# Altium footprint library PcbLib_ICs.PcbLib: 317 footprints (part 21 of 24)
Each footprint in its own frame and in the unit in brackets; x right, y up, seen from the top. Pads: shape width x height; smd on the part's side, far side on the other; paste and mask are expansions set on the pad; w line width, h text height; cw(c..) or ccw(c..) is an arc to the next point about the centre after c.
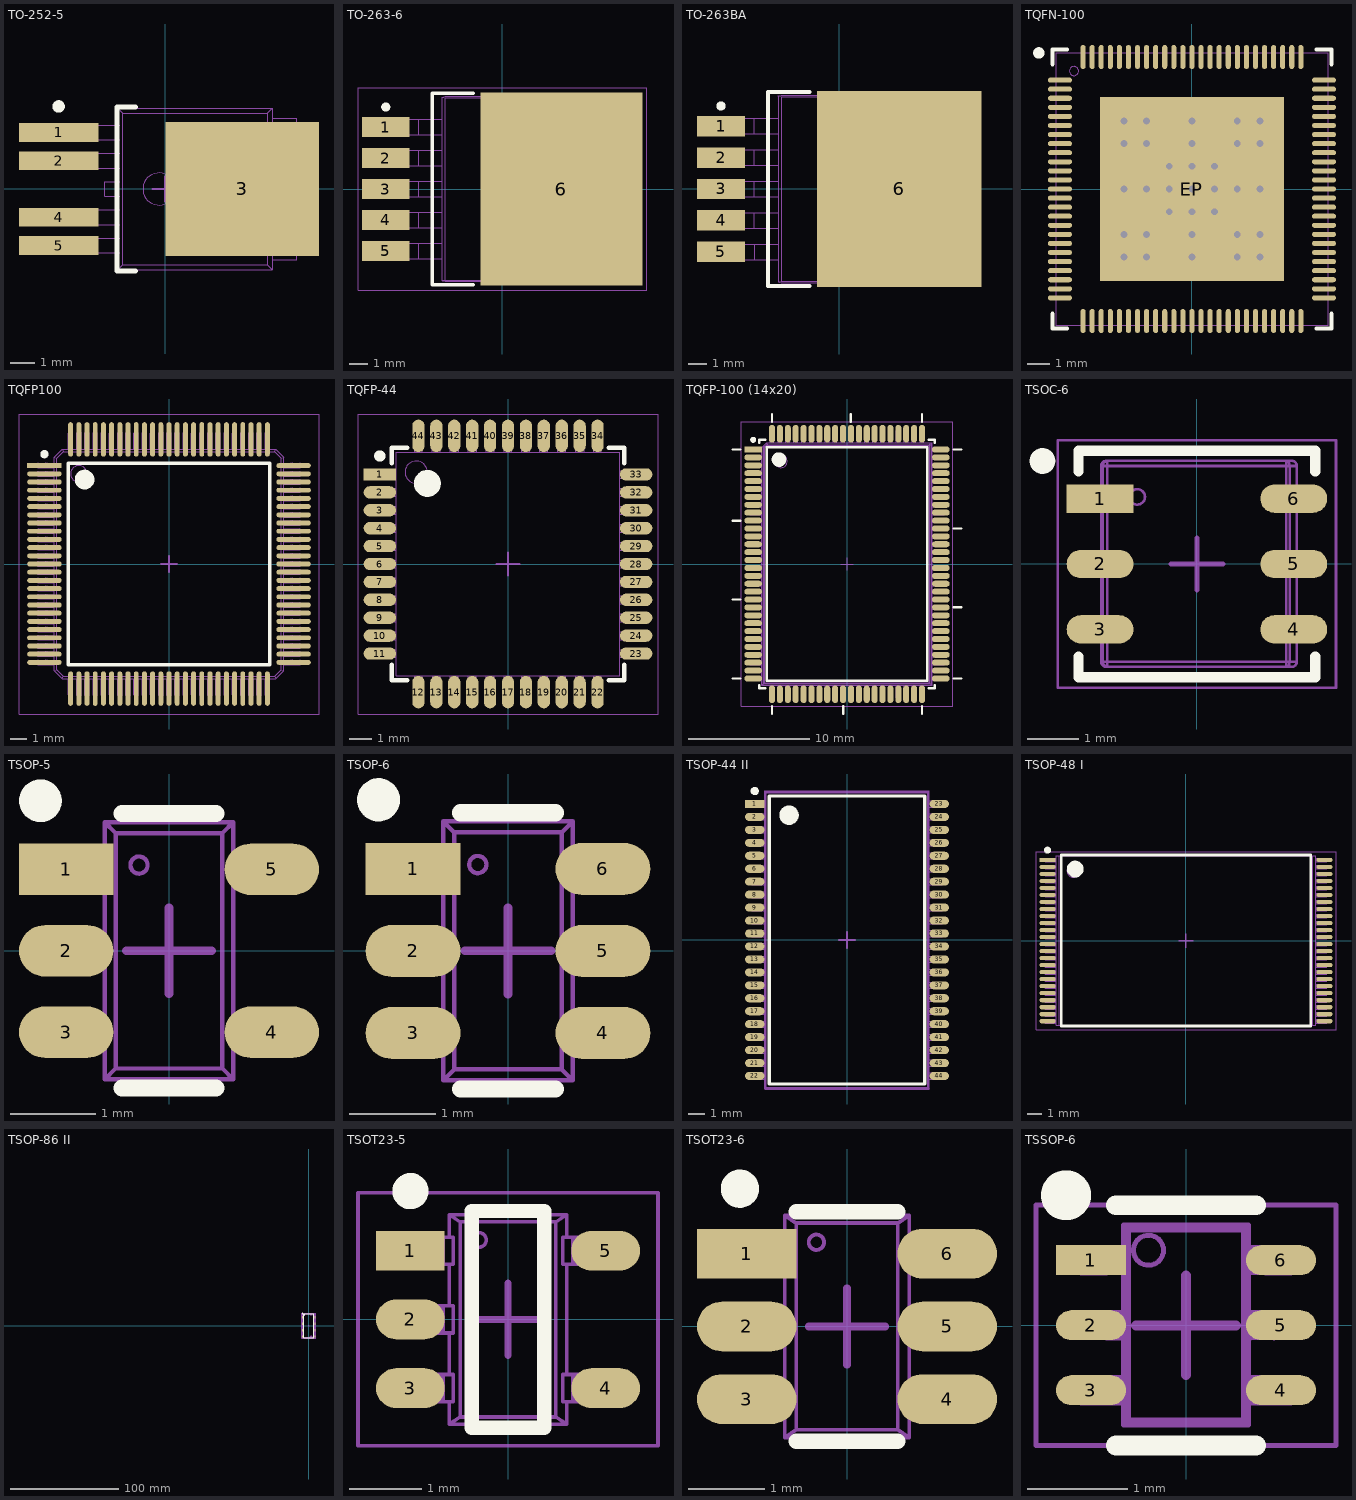
[diagram p20: the footprints below, top view; thin cyan lines are the x and y axes]

## TO-252-5 [mm] "D-PAK, 5-Pads, Body 6.15x6.66mm (max), IPC Medium Density"
height 2.38
pads (5):
  rect 3.2x0.75 smd paste+0 mask+0.05: 1(-4.3,2.28) 2(-4.3,1.14) 4(-4.3,-1.14) 5(-4.3,-2.28)
  rect 6.2x5.4 smd paste-50 mask+0.05: 3(3.1,0)
Top Overlay:
  circle w0.25: c-4.3,3.33 r0.125
  lines w0.2: -1.2,-3.3 -1.95,-3.3 -1.95,3.3 -1.2,3.3
Top Paste:
  region: 0.65,2.1 0.65,2.7 0.05,2.7 0.05,2.1
  region: 1.45,2.1 1.45,2.7 0.85,2.7 0.85,2.1
  region: 2.25,2.1 2.25,2.7 1.65,2.7 1.65,2.1
  region: 3.05,2.1 3.05,2.7 2.45,2.7 2.45,2.1
  region: 3.85,2.1 3.85,2.7 3.25,2.7 3.25,2.1
  region: 4.65,2.1 4.65,2.7 4.05,2.7 4.05,2.1
  region: 5.45,2.1 5.45,2.7 4.85,2.7 4.85,2.1
  region: 0.65,1.3 0.65,1.9 0.05,1.9 0.05,1.3
  region: 1.45,1.3 1.45,1.9 0.85,1.9 0.85,1.3
  region: 2.25,1.3 2.25,1.9 1.65,1.9 1.65,1.3
  region: 3.05,1.3 3.05,1.9 2.45,1.9 2.45,1.3
  region: 3.85,1.3 3.85,1.9 3.25,1.9 3.25,1.3
  region: 4.65,1.3 4.65,1.9 4.05,1.9 4.05,1.3
  region: 5.45,1.3 5.45,1.9 4.85,1.9 4.85,1.3
  region: 0.65,0.5 0.65,1.1 0.05,1.1 0.05,0.5
  region: 1.45,0.5 1.45,1.1 0.85,1.1 0.85,0.5
  region: 2.25,0.5 2.25,1.1 1.65,1.1 1.65,0.5
  region: 3.05,0.5 3.05,1.1 2.45,1.1 2.45,0.5
  region: 3.85,0.5 3.85,1.1 3.25,1.1 3.25,0.5
  region: 4.65,0.5 4.65,1.1 4.05,1.1 4.05,0.5
  region: 5.45,0.5 5.45,1.1 4.85,1.1 4.85,0.5
  region: 0.65,-0.3 0.65,0.3 0.05,0.3 0.05,-0.3
  region: 1.45,-0.3 1.45,0.3 0.85,0.3 0.85,-0.3
  region: 2.25,-0.3 2.25,0.3 1.65,0.3 1.65,-0.3
  region: 3.05,-0.3 3.05,0.3 2.45,0.3 2.45,-0.3
  region: 3.85,-0.3 3.85,0.3 3.25,0.3 3.25,-0.3
  region: 4.65,-0.3 4.65,0.3 4.05,0.3 4.05,-0.3
  region: 5.45,-0.3 5.45,0.3 4.85,0.3 4.85,-0.3
  region: 0.65,-1.1 0.65,-0.5 0.05,-0.5 0.05,-1.1
  region: 1.45,-1.1 1.45,-0.5 0.85,-0.5 0.85,-1.1
  region: 2.25,-1.1 2.25,-0.5 1.65,-0.5 1.65,-1.1
  region: 3.05,-1.1 3.05,-0.5 2.45,-0.5 2.45,-1.1
  region: 3.85,-1.1 3.85,-0.5 3.25,-0.5 3.25,-1.1
  region: 4.65,-1.1 4.65,-0.5 4.05,-0.5 4.05,-1.1
  region: 5.45,-1.1 5.45,-0.5 4.85,-0.5 4.85,-1.1
  region: 0.65,-1.9 0.65,-1.3 0.05,-1.3 0.05,-1.9
  region: 1.45,-1.9 1.45,-1.3 0.85,-1.3 0.85,-1.9
  region: 2.25,-1.9 2.25,-1.3 1.65,-1.3 1.65,-1.9
  region: 3.05,-1.9 3.05,-1.3 2.45,-1.3 2.45,-1.9
  region: 3.85,-1.9 3.85,-1.3 3.25,-1.3 3.25,-1.9
  region: 4.65,-1.9 4.65,-1.3 4.05,-1.3 4.05,-1.9
  region: 5.45,-1.9 5.45,-1.3 4.85,-1.3 4.85,-1.9
  region: 0.65,-2.7 0.65,-2.1 0.05,-2.1 0.05,-2.7
  region: 1.45,-2.7 1.45,-2.1 0.85,-2.1 0.85,-2.7
  region: 2.25,-2.7 2.25,-2.1 1.65,-2.1 1.65,-2.7
  region: 3.05,-2.7 3.05,-2.1 2.45,-2.1 2.45,-2.7
  region: 3.85,-2.7 3.85,-2.1 3.25,-2.1 3.25,-2.7
  region: 4.65,-2.7 4.65,-2.1 4.05,-2.1 4.05,-2.7
  region: 5.45,-2.7 5.45,-2.1 4.85,-2.1 4.85,-2.7
Top Assy:
  circle w0.05: c-0.25,0 r0.65
  lines w0.05: -1.91,-2.58 -1.91,-3.25 ; -1.91,-1.98 -1.91,-1.44 ; -1.91,-0.84 -1.91,-0.3 ; -1.91,0.3 -1.91,0.84 ; -1.91,1.44 -1.91,1.98 ; -1.91,2.58 -1.91,3.25 ; -1.839,-2.58 -3.091,-2.58 ; -1.839,-1.98 -3.091,-1.98 ; -1.839,-1.44 -3.091,-1.44 ; -1.839,-0.84 -3.091,-0.84 ; -1.839,-0.3 -2.45,-0.3 -2.45,0.3 -1.839,0.3 ; -1.839,0.84 -3.091,0.84 ; -1.839,1.44 -3.091,1.44 ; -1.839,1.98 -3.091,1.98 ; -1.839,2.58 -3.091,2.58 ; 4.31,-2.85 5.3,-2.85 5.3,-2.2 5.15,-2.2 5.15,2.2 5.3,2.2 5.3,2.85 4.31,2.85 ; -4.159,-2.58 -4.159,-1.98 ; -4.159,-2.58 -3.985,-2.58 ; -4.159,-2.58 -4.6,-2.58 -4.6,-1.98 -4.159,-1.98 ; -4.159,-1.98 -3.985,-1.98 ; -4.159,-1.44 -4.159,-0.84 ; -4.159,-1.44 -3.985,-1.44 ; -4.159,-1.44 -4.6,-1.44 -4.6,-0.84 -4.159,-0.84 ; -4.159,-0.84 -3.985,-0.84 ; -4.159,0.84 -4.159,1.44 ; -4.159,0.84 -3.985,0.84 ; -4.159,0.84 -4.6,0.84 -4.6,1.44 -4.159,1.44 ; -4.159,1.44 -3.985,1.44 ; -4.159,1.98 -4.159,2.58 ; -4.159,1.98 -3.985,1.98 ; -4.159,1.98 -4.6,1.98 -4.6,2.58 -4.159,2.58 ; -4.159,2.58 -3.985,2.58 ; -3.985,-2.58 -3.091,-2.58 ; -3.985,-2.58 -3.985,-1.98 ; -3.985,-1.98 -3.091,-1.98 ; -3.985,-1.44 -3.091,-1.44 ; -3.985,-1.44 -3.985,-0.84 ; -3.985,-0.84 -3.091,-0.84 ; -3.985,0.84 -3.091,0.84 ; -3.985,0.84 -3.985,1.44 ; -3.985,1.44 -3.091,1.44 ; -3.985,1.98 -3.091,1.98 ; -3.985,1.98 -3.985,2.58 ; -3.985,2.58 -3.091,2.58 ; -3.091,-2.58 -3.091,-1.98 ; -3.091,-1.44 -3.091,-0.84 ; -3.091,0.84 -3.091,1.44 ; -3.091,1.98 -3.091,2.58 ; -1.91,-3.25 4.31,-3.25 ; -1.91,-3.25 -1.71,-3.05 ; -1.91,3.25 4.31,3.25 ; -1.91,3.25 -1.71,3.05 ; -1.71,-3.05 4.11,-3.05 ; -1.71,-3.05 -1.71,3.05 ; -1.71,3.05 4.11,3.05 ; 4.11,-3.05 4.11,3.05 ; 4.11,-3.05 4.31,-3.25 ; 4.11,3.05 4.31,3.25 ; 4.31,-3.25 4.31,3.25
  text ".Designator" at 1.55,5.162 h3
Top Text:
  lines w0.1: -0.5,0 0.5,0 ; 0,-0.5 0,0.5
3D body "User Library-PG-TO252-5-11-1.STEP": height 2.3, standoff 0, extent -4.6,-3.25 5.3,3.25

## TO-263-6 [mm] "D2-PAK, 6-Pads, Body 7.80x8.61mm (max), IPC Medium Density"
height 4.57
pads (6):
  rect 2.6x1.1 smd: 1(-6.4,3.4) 2(-6.4,1.7) 3(-6.4,0) 4(-6.4,-1.7) 5(-6.4,-3.4)
  rect 8.9x10.6 smd paste-10: 6(3.25,0)
Top Overlay:
  circle w0.25: c-6.4,4.5 r0.125
  lines w0.2: -1.6,-5.25 -3.85,-5.25 -3.85,5.25 -1.6,5.25
Top Paste:
  rectangle: 6.4,-3.95 7.4,-2.95
  rectangle: 6.4,-2.8 7.4,-1.8
  rectangle: 6.4,-1.65 7.4,-0.65
  rectangle: 6.4,-0.5 7.4,0.5
  rectangle: 6.4,0.65 7.4,1.65
  rectangle: 6.4,1.8 7.4,2.8
  rectangle: 6.4,2.95 7.4,3.95
  rectangle: 6.4,4.1 7.4,5.1
  rectangle: 5.167,-3.95 6.167,-2.95
  rectangle: 5.167,-2.8 6.167,-1.8
  rectangle: 5.167,-1.65 6.167,-0.65
  rectangle: 5.167,-0.5 6.167,0.5
  rectangle: 5.167,0.65 6.167,1.65
  rectangle: 5.167,1.8 6.167,2.8
  rectangle: 5.167,2.95 6.167,3.95
  rectangle: 5.167,4.1 6.167,5.1
  rectangle: 3.933,-3.95 4.933,-2.95
  rectangle: 3.933,-2.8 4.933,-1.8
  rectangle: 3.933,-1.65 4.933,-0.65
  rectangle: 3.933,-0.5 4.933,0.5
  rectangle: 3.933,0.65 4.933,1.65
  rectangle: 3.933,1.8 4.933,2.8
  rectangle: 3.933,2.95 4.933,3.95
  rectangle: 3.933,4.1 4.933,5.1
  rectangle: 2.7,-3.95 3.7,-2.95
  rectangle: 2.7,-2.8 3.7,-1.8
  rectangle: 2.7,-1.65 3.7,-0.65
  rectangle: 2.7,-0.5 3.7,0.5
  rectangle: 2.7,0.65 3.7,1.65
  rectangle: 2.7,1.8 3.7,2.8
  rectangle: 2.7,2.95 3.7,3.95
  rectangle: 2.7,4.1 3.7,5.1
  rectangle: 1.467,-3.95 2.467,-2.95
  rectangle: 1.467,-2.8 2.467,-1.8
  rectangle: 1.467,-1.65 2.467,-0.65
  rectangle: 1.467,-0.5 2.467,0.5
  rectangle: 1.467,0.65 2.467,1.65
  rectangle: 1.467,1.8 2.467,2.8
  rectangle: 1.467,2.95 2.467,3.95
  rectangle: 1.467,4.1 2.467,5.1
  rectangle: 0.233,-3.95 1.233,-2.95
  rectangle: 0.233,-2.8 1.233,-1.8
  rectangle: 0.233,-1.65 1.233,-0.65
  rectangle: 0.233,-0.5 1.233,0.5
  rectangle: 0.233,0.65 1.233,1.65
  rectangle: 0.233,1.8 1.233,2.8
  rectangle: 0.233,2.95 1.233,3.95
  rectangle: 0.233,4.1 1.233,5.1
  rectangle: -1,4.1 0,5.1
  rectangle: -1,2.95 0,3.95
  rectangle: -1,1.8 0,2.8
  rectangle: -1,0.65 0,1.65
  rectangle: -1,-0.5 0,0.5
  rectangle: -1,-1.65 0,-0.65
  rectangle: -1,-2.8 0,-1.8
  rectangle: -1,-3.95 0,-2.95
  rectangle: 6.4,-5.1 7.4,-4.1
  rectangle: 5.167,-5.1 6.167,-4.1
  rectangle: 3.933,-5.1 4.933,-4.1
  rectangle: 2.7,-5.1 3.7,-4.1
  rectangle: 1.467,-5.1 2.467,-4.1
  rectangle: 0.233,-5.1 1.233,-4.1
  rectangle: -1,-5.1 0,-4.1
Top Assy:
  lines w0.05: -3.303,-3.827 -4.598,-3.827 ; -3.303,-2.987 -4.598,-2.987 ; -3.303,-2.122 -4.598,-2.122 ; -3.303,-1.282 -4.598,-1.282 ; -3.303,-0.417 -4.598,-0.417 ; -3.303,0.423 -4.598,0.423 ; -3.303,1.288 -4.598,1.288 ; -3.303,2.128 -4.598,2.128 ; -3.303,2.993 -4.598,2.993 ; -3.303,3.833 -4.598,3.833 ; -6.648,-3.827 -5.928,-3.827 ; -6.648,-3.827 -6.648,-2.987 ; -6.648,-3.827 -7.413,-3.827 -7.413,-2.987 -6.648,-2.987 ; -6.648,-2.987 -5.928,-2.987 ; -6.648,-2.122 -5.928,-2.122 ; -6.648,-2.122 -6.648,-1.282 ; -6.648,-2.122 -7.413,-2.122 -7.413,-1.282 -6.648,-1.282 ; -6.648,-1.282 -5.928,-1.282 ; -6.648,-0.417 -5.928,-0.417 ; -6.648,-0.417 -6.648,0.423 ; -6.648,-0.417 -7.413,-0.417 -7.413,0.423 -6.648,0.423 ; -6.648,0.423 -5.928,0.423 ; -6.648,1.288 -5.928,1.288 ; -6.648,1.288 -6.648,2.128 ; -6.648,1.288 -7.413,1.288 -7.413,2.128 -6.648,2.128 ; -6.648,2.128 -5.928,2.128 ; -6.648,2.993 -5.928,2.993 ; -6.648,2.993 -6.648,3.833 ; -6.648,2.993 -7.413,2.993 -7.413,3.833 -6.648,3.833 ; -6.648,3.833 -5.928,3.833 ; -5.928,-3.827 -4.598,-3.827 ; -5.928,-3.827 -5.928,-2.987 ; -5.928,-2.987 -4.598,-2.987 ; -5.928,-2.122 -5.928,-1.282 ; -5.928,-2.122 -4.598,-2.122 ; -5.928,-1.282 -4.598,-1.282 ; -5.928,-0.417 -5.928,0.423 ; -5.928,-0.417 -4.598,-0.417 ; -5.928,0.423 -4.598,0.423 ; -5.928,1.288 -5.928,2.128 ; -5.928,1.288 -4.598,1.288 ; -5.928,2.128 -4.598,2.128 ; -5.928,2.993 -4.598,2.993 ; -5.928,2.993 -5.928,3.833 ; -5.928,3.833 -4.598,3.833 ; -4.598,-3.827 -4.598,-2.987 ; -4.598,-2.122 -4.598,-1.282 ; -4.598,-0.417 -4.598,0.423 ; -4.598,1.288 -4.598,2.128 ; -4.598,2.993 -4.598,3.833 ; -3.303,-5.022 -3.303,5.028 ; -3.303,-5.022 -3.303,-5.032 -3.124,-5.077 5.332,-5.077 ; -3.303,-5.022 -3.128,-4.998 ; -3.303,5.028 -3.303,5.038 -3.124,5.083 5.332,5.083 ; -3.303,5.028 -3.128,5.004 ; -3.128,-4.998 4.93,-4.998 ; -3.128,-4.998 -3.128,5.004 ; -3.128,5.004 4.93,5.004 ; 4.93,-4.998 4.93,5.004 ; 4.93,-4.998 5.332,-5.055 5.332,-3.807 ; 4.93,5.004 5.332,5.061 5.332,3.813 ; 5.332,-5.077 6.252,-5.077 6.602,-3.769 6.602,3.775 6.252,5.083 5.332,5.083 ; 5.332,-5.077 5.332,-3.807 ; 5.332,-3.807 5.332,3.813 ; 5.332,3.813 5.332,5.083
  text ".Designator" at -3.443,-0.467 h2
Top Text:
  lines w0.05: -7.925,-5.55 7.925,-5.55 7.925,5.55 -7.925,5.55 -7.925,-5.55
  lines w0.1: -0.5,0 0.5,0 ; 0,-0.5 0,0.5
3D body "SW3dPS-LTC DD-PAK.STEP": height 4.5, standoff 0.01, extent -7.382,-5.062 6.969,5.162

## TO-263BA [mm] "D2-PAK, 6-Pads, Body 7.80x8.61mm (max), IPC Medium Density"
height 4.57
pads (6):
  rect 2.6x1.1 smd: 1(-6.4,3.4) 2(-6.4,1.7) 3(-6.4,0) 4(-6.4,-1.7) 5(-6.4,-3.4)
  rect 8.9x10.6 smd paste-10: 6(3.25,0)
Top Overlay:
  circle w0.25: c-6.4,4.5 r0.125
  lines w0.2: -1.6,-5.25 -3.85,-5.25 -3.85,5.25 -1.6,5.25
Top Paste:
  rectangle: 6.4,-3.95 7.4,-2.95
  rectangle: 6.4,-2.8 7.4,-1.8
  rectangle: 6.4,-1.65 7.4,-0.65
  rectangle: 6.4,-0.5 7.4,0.5
  rectangle: 6.4,0.65 7.4,1.65
  rectangle: 6.4,1.8 7.4,2.8
  rectangle: 6.4,2.95 7.4,3.95
  rectangle: 6.4,4.1 7.4,5.1
  rectangle: 5.167,-3.95 6.167,-2.95
  rectangle: 5.167,-2.8 6.167,-1.8
  rectangle: 5.167,-1.65 6.167,-0.65
  rectangle: 5.167,-0.5 6.167,0.5
  rectangle: 5.167,0.65 6.167,1.65
  rectangle: 5.167,1.8 6.167,2.8
  rectangle: 5.167,2.95 6.167,3.95
  rectangle: 5.167,4.1 6.167,5.1
  rectangle: 3.933,-3.95 4.933,-2.95
  rectangle: 3.933,-2.8 4.933,-1.8
  rectangle: 3.933,-1.65 4.933,-0.65
  rectangle: 3.933,-0.5 4.933,0.5
  rectangle: 3.933,0.65 4.933,1.65
  rectangle: 3.933,1.8 4.933,2.8
  rectangle: 3.933,2.95 4.933,3.95
  rectangle: 3.933,4.1 4.933,5.1
  rectangle: 2.7,-3.95 3.7,-2.95
  rectangle: 2.7,-2.8 3.7,-1.8
  rectangle: 2.7,-1.65 3.7,-0.65
  rectangle: 2.7,-0.5 3.7,0.5
  rectangle: 2.7,0.65 3.7,1.65
  rectangle: 2.7,1.8 3.7,2.8
  rectangle: 2.7,2.95 3.7,3.95
  rectangle: 2.7,4.1 3.7,5.1
  rectangle: 1.467,-3.95 2.467,-2.95
  rectangle: 1.467,-2.8 2.467,-1.8
  rectangle: 1.467,-1.65 2.467,-0.65
  rectangle: 1.467,-0.5 2.467,0.5
  rectangle: 1.467,0.65 2.467,1.65
  rectangle: 1.467,1.8 2.467,2.8
  rectangle: 1.467,2.95 2.467,3.95
  rectangle: 1.467,4.1 2.467,5.1
  rectangle: 0.233,-3.95 1.233,-2.95
  rectangle: 0.233,-2.8 1.233,-1.8
  rectangle: 0.233,-1.65 1.233,-0.65
  rectangle: 0.233,-0.5 1.233,0.5
  rectangle: 0.233,0.65 1.233,1.65
  rectangle: 0.233,1.8 1.233,2.8
  rectangle: 0.233,2.95 1.233,3.95
  rectangle: 0.233,4.1 1.233,5.1
  rectangle: -1,4.1 0,5.1
  rectangle: -1,2.95 0,3.95
  rectangle: -1,1.8 0,2.8
  rectangle: -1,0.65 0,1.65
  rectangle: -1,-0.5 0,0.5
  rectangle: -1,-1.65 0,-0.65
  rectangle: -1,-2.8 0,-1.8
  rectangle: -1,-3.95 0,-2.95
  rectangle: 6.4,-5.1 7.4,-4.1
  rectangle: 5.167,-5.1 6.167,-4.1
  rectangle: 3.933,-5.1 4.933,-4.1
  rectangle: 2.7,-5.1 3.7,-4.1
  rectangle: 1.467,-5.1 2.467,-4.1
  rectangle: 0.233,-5.1 1.233,-4.1
  rectangle: -1,-5.1 0,-4.1
Top Assy:
  lines w0.05: -3.303,-3.827 -4.598,-3.827 ; -3.303,-2.987 -4.598,-2.987 ; -3.303,-2.122 -4.598,-2.122 ; -3.303,-1.282 -4.598,-1.282 ; -3.303,-0.417 -4.598,-0.417 ; -3.303,0.423 -4.598,0.423 ; -3.303,1.288 -4.598,1.288 ; -3.303,2.128 -4.598,2.128 ; -3.303,2.993 -4.598,2.993 ; -3.303,3.833 -4.598,3.833 ; -6.648,-3.827 -5.928,-3.827 ; -6.648,-3.827 -6.648,-2.987 ; -6.648,-3.827 -7.413,-3.827 -7.413,-2.987 -6.648,-2.987 ; -6.648,-2.987 -5.928,-2.987 ; -6.648,-2.122 -5.928,-2.122 ; -6.648,-2.122 -6.648,-1.282 ; -6.648,-2.122 -7.413,-2.122 -7.413,-1.282 -6.648,-1.282 ; -6.648,-1.282 -5.928,-1.282 ; -6.648,-0.417 -5.928,-0.417 ; -6.648,-0.417 -6.648,0.423 ; -6.648,-0.417 -7.413,-0.417 -7.413,0.423 -6.648,0.423 ; -6.648,0.423 -5.928,0.423 ; -6.648,1.288 -5.928,1.288 ; -6.648,1.288 -6.648,2.128 ; -6.648,1.288 -7.413,1.288 -7.413,2.128 -6.648,2.128 ; -6.648,2.128 -5.928,2.128 ; -6.648,2.993 -5.928,2.993 ; -6.648,2.993 -6.648,3.833 ; -6.648,2.993 -7.413,2.993 -7.413,3.833 -6.648,3.833 ; -6.648,3.833 -5.928,3.833 ; -5.928,-3.827 -4.598,-3.827 ; -5.928,-3.827 -5.928,-2.987 ; -5.928,-2.987 -4.598,-2.987 ; -5.928,-2.122 -5.928,-1.282 ; -5.928,-2.122 -4.598,-2.122 ; -5.928,-1.282 -4.598,-1.282 ; -5.928,-0.417 -5.928,0.423 ; -5.928,-0.417 -4.598,-0.417 ; -5.928,0.423 -4.598,0.423 ; -5.928,1.288 -5.928,2.128 ; -5.928,1.288 -4.598,1.288 ; -5.928,2.128 -4.598,2.128 ; -5.928,2.993 -4.598,2.993 ; -5.928,2.993 -5.928,3.833 ; -5.928,3.833 -4.598,3.833 ; -4.598,-3.827 -4.598,-2.987 ; -4.598,-2.122 -4.598,-1.282 ; -4.598,-0.417 -4.598,0.423 ; -4.598,1.288 -4.598,2.128 ; -4.598,2.993 -4.598,3.833 ; -3.303,-5.022 -3.303,5.028 ; -3.303,-5.022 -3.303,-5.032 -3.124,-5.077 5.332,-5.077 ; -3.303,-5.022 -3.128,-4.998 ; -3.303,5.028 -3.303,5.038 -3.124,5.083 5.332,5.083 ; -3.303,5.028 -3.128,5.004 ; -3.128,-4.998 4.93,-4.998 ; -3.128,-4.998 -3.128,5.004 ; -3.128,5.004 4.93,5.004 ; 4.93,-4.998 4.93,5.004 ; 4.93,-4.998 5.332,-5.055 5.332,-3.807 ; 4.93,5.004 5.332,5.061 5.332,3.813 ; 5.332,-5.077 6.252,-5.077 6.602,-3.769 6.602,3.775 6.252,5.083 5.332,5.083 ; 5.332,-5.077 5.332,-3.807 ; 5.332,-3.807 5.332,3.813 ; 5.332,3.813 5.332,5.083
  text ".Designator" at -5.162,-0.7 h3
Top Text:
  lines w0.1: -0.5,0 0.5,0 ; 0,-0.5 0,0.5
3D body "User Library-TO-263BA-1.step": height 4.38, standoff 0, extent -7.477,-5.112 6.569,5.112

## TQFN-100 [mm] "QFN, 100 pin, 12x12 body, 0.4mm pitch, EPAD 6.9mm, gang masked, windowed paste"
height 1
pads (101):
  oval 1.06x0.222 smd paste+0 mask+0.05: 1(-5.82,4.8) 2(-5.82,4.4) 3(-5.82,4) 4(-5.82,3.6) 5(-5.82,3.2) 6(-5.82,2.8) 7(-5.82,2.4) 8(-5.82,2) 9(-5.82,1.6) 10(-5.82,1.2) 11(-5.82,0.8) 12(-5.82,0.4) 13(-5.82,0) 14(-5.82,-0.4) 15(-5.82,-0.8) 16(-5.82,-1.2) 17(-5.82,-1.6) 18(-5.82,-2) 19(-5.82,-2.4) 20(-5.82,-2.8) 21(-5.82,-3.2) 22(-5.82,-3.6) 23(-5.82,-4) 24(-5.82,-4.4) 25(-5.82,-4.8) 51(5.82,-4.8) 52(5.82,-4.4) 53(5.82,-4) 54(5.82,-3.6) 55(5.82,-3.2) 56(5.82,-2.8) 57(5.82,-2.4) 58(5.82,-2) 59(5.82,-1.6) 60(5.82,-1.2) 61(5.82,-0.8) 62(5.82,-0.4) 63(5.82,0) 64(5.82,0.4) 65(5.82,0.8) 66(5.82,1.2) 67(5.82,1.6) 68(5.82,2) 69(5.82,2.4) 70(5.82,2.8) 71(5.82,3.2) 72(5.82,3.6) 73(5.82,4) 74(5.82,4.4) 75(5.82,4.8)
  oval 0.222x1.06 smd paste+0 mask+0.05: 26(-4.8,-5.82) 27(-4.4,-5.82) 28(-4,-5.82) 29(-3.6,-5.82) 30(-3.2,-5.82) 31(-2.8,-5.82) 32(-2.4,-5.82) 33(-2,-5.82) 34(-1.6,-5.82) 35(-1.2,-5.82) 36(-0.8,-5.82) 37(-0.4,-5.82) 38(0,-5.82) 39(0.4,-5.82) 40(0.8,-5.82) 41(1.2,-5.82) 42(1.6,-5.82) 43(2,-5.82) 44(2.4,-5.82) 45(2.8,-5.82) 46(3.2,-5.82) 47(3.6,-5.82) 48(4,-5.82) 49(4.4,-5.82) 50(4.8,-5.82) 76(4.8,5.82) 77(4.4,5.82) 78(4,5.82) 79(3.6,5.82) 80(3.2,5.82) 81(2.8,5.82) 82(2.4,5.82) 83(2,5.82) 84(1.6,5.82) 85(1.2,5.82) 86(0.8,5.82) 87(0.4,5.82) 88(0,5.82) 89(-0.4,5.82) 90(-0.8,5.82) 91(-1.2,5.82) 92(-1.6,5.82) 93(-2,5.82) 94(-2.4,5.82) 95(-2.8,5.82) 96(-3.2,5.82) 97(-3.6,5.82) 98(-4,5.82) 99(-4.4,5.82) 100(-4.8,5.82)
  rect 8.1x8.1 smd paste-50 mask+0.05: EP(0,0)
via 0,0 diameter 0.7 hole 0.3
via 0,1 diameter 0.7 hole 0.3
via -1,0 diameter 0.7 hole 0.3
via 0,-1 diameter 0.7 hole 0.3
via 1,0 diameter 0.7 hole 0.3
via 0,2 diameter 0.7 hole 0.3
via 0,-2 diameter 0.7 hole 0.3
via 2,0 diameter 0.7 hole 0.3
via -2,0 diameter 0.7 hole 0.3
via -3,0 diameter 0.7 hole 0.3
via 0,3 diameter 0.7 hole 0.3
via 3,0 diameter 0.7 hole 0.3
via 0,-3 diameter 0.7 hole 0.3
via 1,-1 diameter 0.7 hole 0.3
via 2,-2 diameter 0.7 hole 0.3
via 2,-3 diameter 0.7 hole 0.3
via 3,-2 diameter 0.7 hole 0.3
via 2,3 diameter 0.7 hole 0.3
via 3,2 diameter 0.7 hole 0.3
via 2,2 diameter 0.7 hole 0.3
via 1,1 diameter 0.7 hole 0.3
via -3,2 diameter 0.7 hole 0.3
via -2,3 diameter 0.7 hole 0.3
via -2,2 diameter 0.7 hole 0.3
via -1,1 diameter 0.7 hole 0.3
via -2,-3 diameter 0.7 hole 0.3
via -3,-2 diameter 0.7 hole 0.3
via -2,-2 diameter 0.7 hole 0.3
via -1,-1 diameter 0.7 hole 0.3
via -3,3 diameter 0.7 hole 0.3
via 3,3 diameter 0.7 hole 0.3
via 3,-3 diameter 0.7 hole 0.3
via -3,-3 diameter 0.7 hole 0.3
Top Overlay:
  circle w0.25: c-6.75,6 r0.125
  lines w0.178: -6.15,-5.5 -6.15,-6.15 -5.5,-6.15 ; -6.15,5.5 -6.15,6.15 -5.5,6.15 ; 5.5,-6.15 6.15,-6.15 6.15,-5.5 ; 5.5,6.15 6.15,6.15 6.15,5.5
Top Paste:
  region: 2.653,-2.697 1.653,-2.697 1.653,-1.697 2.653,-1.697
  region: 2.853,-2.697 2.853,-1.697 3.853,-1.697 3.853,-2.697
  region: 2.653,-3.897 1.653,-3.897 1.653,-2.897 2.653,-2.897
  region: 3.853,-3.897 2.853,-3.897 2.853,-2.897 3.853,-2.897
  region: -2.65,-2.7 -1.65,-2.7 -1.65,-1.7 -2.65,-1.7
  region: -2.85,-2.7 -2.85,-1.7 -3.85,-1.7 -3.85,-2.7
  region: -2.65,-3.9 -1.65,-3.9 -1.65,-2.9 -2.65,-2.9
  region: -3.85,-3.9 -2.85,-3.9 -2.85,-2.9 -3.85,-2.9
  region: 2.65,2.7 1.65,2.7 1.65,1.7 2.65,1.7
  region: 2.85,2.7 2.85,1.7 3.85,1.7 3.85,2.7
  region: 2.65,3.9 1.65,3.9 1.65,2.9 2.65,2.9
  region: 3.85,3.9 2.85,3.9 2.85,2.9 3.85,2.9
  region: -2.65,2.7 -1.65,2.7 -1.65,1.7 -2.65,1.7
  region: -2.85,2.7 -2.85,1.7 -3.85,1.7 -3.85,2.7
  region: -2.65,3.9 -1.65,3.9 -1.65,2.9 -2.65,2.9
  region: 4.05,0.419 4.05,-0.47 1.425,-0.47 1.425,0.419
  region: 0.439,-4.062 -0.45,-4.062 -0.45,-1.438 0.439,-1.438
  region: -4.049,-0.445 -4.05,0.445 -1.425,0.445 -1.425,-0.445
  region: -0.45,4.062 0.439,4.062 0.439,1.438 -0.45,1.438
  region: -0.508,0.508 0.508,0.508 0.508,-0.508 -0.508,-0.508
  region: -3.85,3.9 -2.85,3.9 -2.85,2.9 -3.85,2.9
Bottom Solder:
  region: -4.25,4.25 -4.25,0.75 -3.5,0 -4.25,-0.75 -4.25,-4.25 -0.75,-4.25 0,-3.5 0.75,-4.25 4.25,-4.25 4.25,-0.75 3.5,0 4.25,0.75 4.25,4.25 0.75,4.25 0,3.5 -0.75,4.25
Top Assy:
  circle w0.05: c-5.2,5.2 r0.202
  lines w0.05: -6,-6 6,-6 ; -6,-6 -6,6 ; -6,-6 -6,6 ; -6,-6 6,-6 ; -6,6 6,6 ; -6,6 6,6 ; 6,-6 6,6 ; 6,-6 6,6
  text ".Designator" at -2.421,-0.332 h1.4
Top Text:
  lines w0.1: -0.5,0 0.5,0 ; 0,-0.5 0,0.5
3D body: height 1, standoff 0.01, extent -5.995,-5.995 5.995,5.995

## TQFP100 [mm] "Thin QFP, 100-Leads, Body 14x14mm, Pitch 0.5mm, IPC Low Density"
height 1.2
pads (100):
  rect 2.1x0.3 smd paste+0 mask+0.075: 1(-7.6,6)
  oval 2.1x0.3 smd paste+0 mask+0.075: 2(-7.6,5.5) 3(-7.6,5) 4(-7.6,4.5) 5(-7.6,4) 6(-7.6,3.5) 7(-7.6,3) 8(-7.6,2.5) 9(-7.6,2) 10(-7.6,1.5) 11(-7.6,1) 12(-7.6,0.5) 13(-7.6,0) 14(-7.6,-0.5) 15(-7.6,-1) 16(-7.6,-1.5) 17(-7.6,-2) 18(-7.6,-2.5) 19(-7.6,-3) 20(-7.6,-3.5) 21(-7.6,-4) 22(-7.6,-4.5) 23(-7.6,-5) 24(-7.6,-5.5) 25(-7.6,-6) 51(7.6,-6) 52(7.6,-5.5) 53(7.6,-5) 54(7.6,-4.5) 55(7.6,-4) 56(7.6,-3.5) 57(7.6,-3) 58(7.6,-2.5) 59(7.6,-2) 60(7.6,-1.5) 61(7.6,-1) 62(7.6,-0.5) 63(7.6,0) 64(7.6,0.5) 65(7.6,1) 66(7.6,1.5) 67(7.6,2) 68(7.6,2.5) 69(7.6,3) 70(7.6,3.5) 71(7.6,4) 72(7.6,4.5) 73(7.6,5) 74(7.6,5.5) 75(7.6,6)
  oval 0.3x2.1 smd paste+0 mask+0.075: 26(-6,-7.6) 27(-5.5,-7.6) 28(-5,-7.6) 29(-4.5,-7.6) 30(-4,-7.6) 31(-3.5,-7.6) 32(-3,-7.6) 33(-2.5,-7.6) 34(-2,-7.6) 35(-1.5,-7.6) 36(-1,-7.6) 37(-0.5,-7.6) 38(0,-7.6) 39(0.5,-7.6) 40(1,-7.6) 41(1.5,-7.6) 42(2,-7.6) 43(2.5,-7.6) 44(3,-7.6) 45(3.5,-7.6) 46(4,-7.6) 47(4.5,-7.6) 48(5,-7.6) 49(5.5,-7.6) 50(6,-7.6) 76(6,7.6) 77(5.5,7.6) 78(5,7.6) 79(4.5,7.6) 80(4,7.6) 81(3.5,7.6) 82(3,7.6) 83(2.5,7.6) 84(2,7.6) 85(1.5,7.6) 86(1,7.6) 87(0.5,7.6) 88(0,7.6) 89(-0.5,7.6) 90(-1,7.6) 91(-1.5,7.6) 92(-2,7.6) 93(-2.5,7.6) 94(-3,7.6) 95(-3.5,7.6) 96(-4,7.6) 97(-4.5,7.6) 98(-5,7.6) 99(-5.5,7.6) 100(-6,7.6)
Top Overlay:
  circle w0.25: c-7.6,6.7 r0.125
  circle w0.6: c-5.15,5.15 r0.3
  lines w0.2: -6.15,-6.15 -6.15,6.15 6.15,6.15 6.15,-6.15 -6.15,-6.15
Top Assy:
  drawing of 4025 lines, arcs and shapes, not listed
  text ".Designator" at -3.443,-0.467 h2
Top Text:
  lines w0.05: -9.15,-9.15 -9.15,9.15 9.15,9.15 9.15,-9.15 -9.15,-9.15
  lines w0.1: -0.5,0 0.5,0 ; 0,-0.5 0,0.5
3D body "TQFP-100-14X14MM.STEP": height 1.13, standoff -0.02, extent -8.003,-8.003 7.984,7.984
